# Altium footprint library cool_library.PcbLib: 1182 footprints (part 49 of 75)
Each footprint in its own frame and in the unit in brackets; x right, y up, seen from the top. Pads: shape width x height; smd on the part's side, far side on the other; paste and mask are expansions set on the pad; w line width, h text height; cw(c..) or ccw(c..) is an arc to the next point about the centre after c.
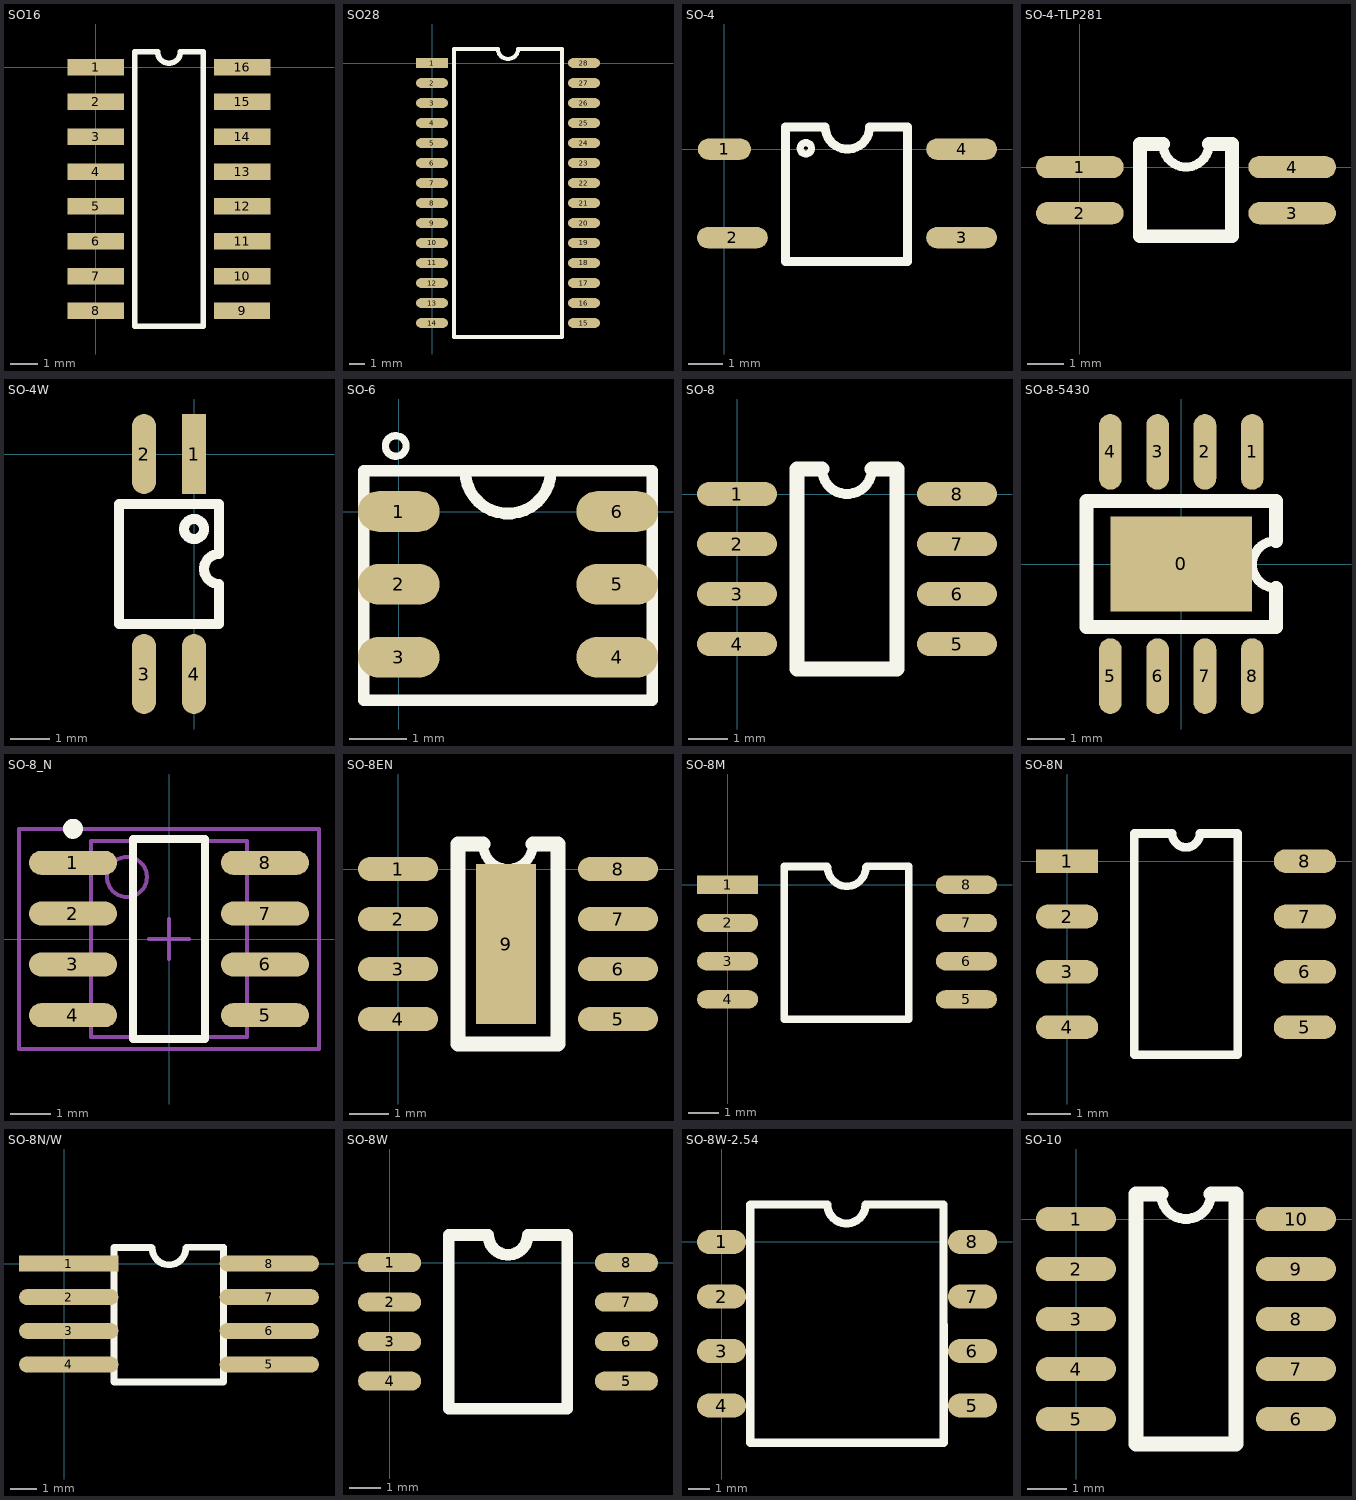
[diagram p48: the footprints below, top view; thin cyan lines are the x and y axes]

## SO16 [mm]
pads (16):
  rect 2.05x0.6 smd: 1(0,0) 2(0,-1.27) 3(0,-2.54) 4(0,-3.81) 5(0,-5.08) 6(0,-6.35) 7(0,-7.62) 8(0,-8.89) 9(5.342,-8.89) 10(5.35,-7.62) 11(5.35,-6.35) 12(5.35,-5.08) 13(5.35,-3.81) 14(5.35,-2.54) 15(5.35,-1.27) 16(5.35,0)
Top Overlay:
  lines w0.2: 2.258,0.555 ccw(c2.675,0.555) 3.092,0.555
  lines w0.203: 2.258,0.555 1.425,0.555 1.425,-9.445 3.925,-9.445 3.925,0.555 3.092,0.555

## SO28 [mil]
pads (28):
  rect 80x24 smd: 1(0,0)
  oval 80x24 smd: 2(0,-50) 3(0,-100) 4(0,-150) 5(0,-200) 6(0,-250) 7(0,-300) 8(0,-350) 9(0,-400) 10(0,-450) 11(0,-500) 12(0,-550) 13(0,-600) 14(0,-650) 15(380,-650) 16(380,-600) 17(380,-550) 18(380,-500) 19(380,-450) 20(380,-400) 21(380,-350) 22(380,-300) 23(380,-250) 24(380,-200) 25(380,-150) 26(380,-100) 27(380,-50) 28(380,0)
Top Overlay:
  lines w10: 55,-685 55,35 165,35 ccw(c190,35) 215,35 325,35 325,-685 55,-685

## SO-4 [mil]
pads (4):
  oval 60x24 smd: 1(0,0)
  oval 80x24 smd: 2(9,-100) 3(268,-100) 4(268,0)
Top Overlay:
  circle w8: c92,1 r6.4
  lines w10: 69,-127 207,-127 207,25 164,25 cw(c139,25) 114,25 69,25 69,-127

## SO-4-TLP281 [mil]
pads (4):
  oval 95x24 smd: 1(0,0) 2(0,-50) 3(230,-50) 4(230,0)
Top Overlay:
  lines w10: 90,25 ccw(c115,25) 140,25
  lines w15: 90,25 65,25 65,-75 165,-75 165,25 140,25

## SO-4W [mil]
pads (4):
  rect 24x80 smd: 1(0,0)
  oval 24x80 smd: 2(-50,0) 3(-50,-220) 4(0,-220)
Top Overlay:
  circle w10: c0,-75 r10
  lines w10: -75,-170 -75,-50 25,-50 25,-100 ccw(c25,-115) 25,-130 25,-170 -75,-170

## SO-6 [mil]
pads (6):
  oval 56x28 smd: 1(0,0) 2(0,-50) 3(0,-100) 4(150,-100) 5(150,-50) 6(150,0)
Top Overlay:
  circle w5: c-2.07,45 r7.07
  lines w8: 45.59,28 ccw(c75,28) 104.41,28 ; -24,-129.48 -24,28 174,28 174,-129.48 -24,-129.48

## SO-8 [mil]
pads (8):
  oval 80x24 smd: 1(0,0) 2(0,-50) 3(0,-100) 4(0,-150) 5(220,-150) 6(220,-100) 7(220,-50) 8(220,0)
Top Overlay:
  lines w10: 85,25 ccw(c110,25) 135,25
  lines w15: 85,25 60,25 60,-175 160,-175 160,25 135,25

## SO-8-5430 [mil]
pads (9):
  rect 150x100 smd: 0(0,0)
  oval 24x80 smd: 1(75,118.5) 2(25,118.5) 3(-25,118.5) 4(-75,118.5) 5(-75,-118.5) 6(-25,-118.5) 7(25,-118.5) 8(75,-118.5)
Top Overlay:
  lines w10: 100,-25.5 cw(c100,-0.5) 100,24.5
  lines w15: 100,-25.5 100,-66.5 -100,-66.5 -100,66.5 100,66.5 100,24.5

## SO-8_N [mm] "SOIC, 8-Leads, Body 4.9x3.9mm, Pitch 1.27mm, IPC Medium Density"
height 1.75
pads (8):
  oval 2.2x0.6 smd: 1(-2.4,1.905) 2(-2.4,0.635) 3(-2.4,-0.635) 4(-2.4,-1.905) 5(2.4,-1.905) 6(2.4,-0.635) 7(2.4,0.635) 8(2.4,1.905)
Top Overlay:
  circle w0.25: c-2.4,2.755 r0.125
  lines w0.2: -0.9,-2.5 0.9,-2.5 0.9,2.5 -0.9,2.5 -0.9,-2.5
Mechanical 13:
  circle w0.1: c-1.05,1.55 r0.5
  lines w0.1: -1.95,-2.45 1.95,-2.45 1.95,2.45 -1.95,2.45 -1.95,-2.45
Mechanical 15:
  lines w0.1: -0.5,0 0.5,0 ; 0,-0.5 0,0.5 ; -3.75,-2.75 3.75,-2.75 3.75,2.75 -3.75,2.75 -3.75,-2.75
3D body: height 1.75, standoff 0, extent -1.95,-2.45 1.95,2.45

## SO-8EN [mil]
pads (9):
  oval 80x24 smd: 1(0,0) 2(0,-50) 3(0,-100) 4(0,-150) 5(220,-150) 6(220,-100) 7(220,-50) 8(220,0)
  rect 60x160 smd: 9(108,-75)
Top Overlay:
  lines w10: 85,25 ccw(c110,25) 135,25
  lines w15: 85,25 60,25 60,-175 160,-175 160,25 135,25

## SO-8M [mil]
pads (8):
  rect 80x24 smd: 1(0,0)
  oval 80x24 smd: 2(0,-50) 3(0,-100) 4(0,-150) 5(312.6,-150) 6(312.6,-100) 7(312.6,-50) 8(312.6,0)
Top Overlay:
  lines w10: 130.06,23.94 74.39,23.94 74.39,-176.06 237.01,-176.06 ; 131,23 ccw(c156,23) 181,23 ; 182,24 237.01,24 ; 236.01,23 237.01,24 ; 237.01,-176 237.01,24

## SO-8N [mm]
pads (8):
  rect 1.44x0.55 smd: 1(0,0)
  oval 1.44x0.55 smd: 2(0,-1.28) 3(0,-2.56) 4(0,-3.84) 5(5.5,-3.84) 6(5.5,-2.56) 7(5.5,-1.28) 8(5.5,0)
Top Overlay:
  lines w0.2: 1.555,-4.48 3.945,-4.48 3.945,0.64 3.07,0.64 cw(c2.75,0.64) 2.43,0.64 1.555,0.64 1.555,-4.48

## SO-8N/W [mil]
height 590.55
pads (8):
  rect 147.64x24 smd: 1(6.97,0)
  oval 147.64x24 smd: 2(6.97,-50) 3(6.97,-100) 4(6.97,-150) 5(305,-150) 6(305,-100) 7(305,-50) 8(305,0)
Top Overlay:
  lines w10: 130.06,23.94 74.39,23.94 74.39,-176.06 237.01,-176.06 ; 131,23 ccw(c156,23) 181,23 ; 182,24 237.01,24 ; 236.01,23 237.01,24 ; 237.01,-176 237.01,24

## SO-8W [mil]
pads (8):
  oval 80x24 smd: 1(0,0) 2(0,-50) 3(0,-100) 4(0,-150) 5(300,-150) 6(300,-100) 7(300,-50) 8(300,0)
Top Overlay:
  lines w15: 75,-185 225,-185 225,35 175,35 cw(c150,35) 125,35 75,35 75,-185

## SO-8W-2.54 [mil]
pads (8):
  oval 90x44 smd: 1(0,0) 2(0,-100) 3(0,-200) 4(0,-300) 5(460,-300) 6(460,-200) 7(460,-100) 8(460,0)
Top Overlay:
  lines w15: 52.67,-368.01 52.67,69 194,69 ccw(c229,69) 264,69 407,69 407.33,-368.01 52.67,-368.01

## SO-10 [mil]
pads (10):
  oval 80x24 smd: 1(0,0) 2(0,-50) 3(0,-100) 4(0,-150) 5(0,-200) 6(220,-200) 7(220,-150) 8(220,-100) 9(220,-50) 10(220,0)
Top Overlay:
  lines w10: 85,25 ccw(c110,25) 135,25
  lines w15: 85,25 60,25 60,-225 160,-225 160,25 135,25